# Altium footprint library Conectors.PcbLib: 123 footprints (part 2 of 8)
Each footprint in its own frame and in the unit in brackets; x right, y up, seen from the top. Pads: shape width x height; smd on the part's side, far side on the other; paste and mask are expansions set on the pad; w line width, h text height; cw(c..) or ccw(c..) is an arc to the next point about the centre after c.
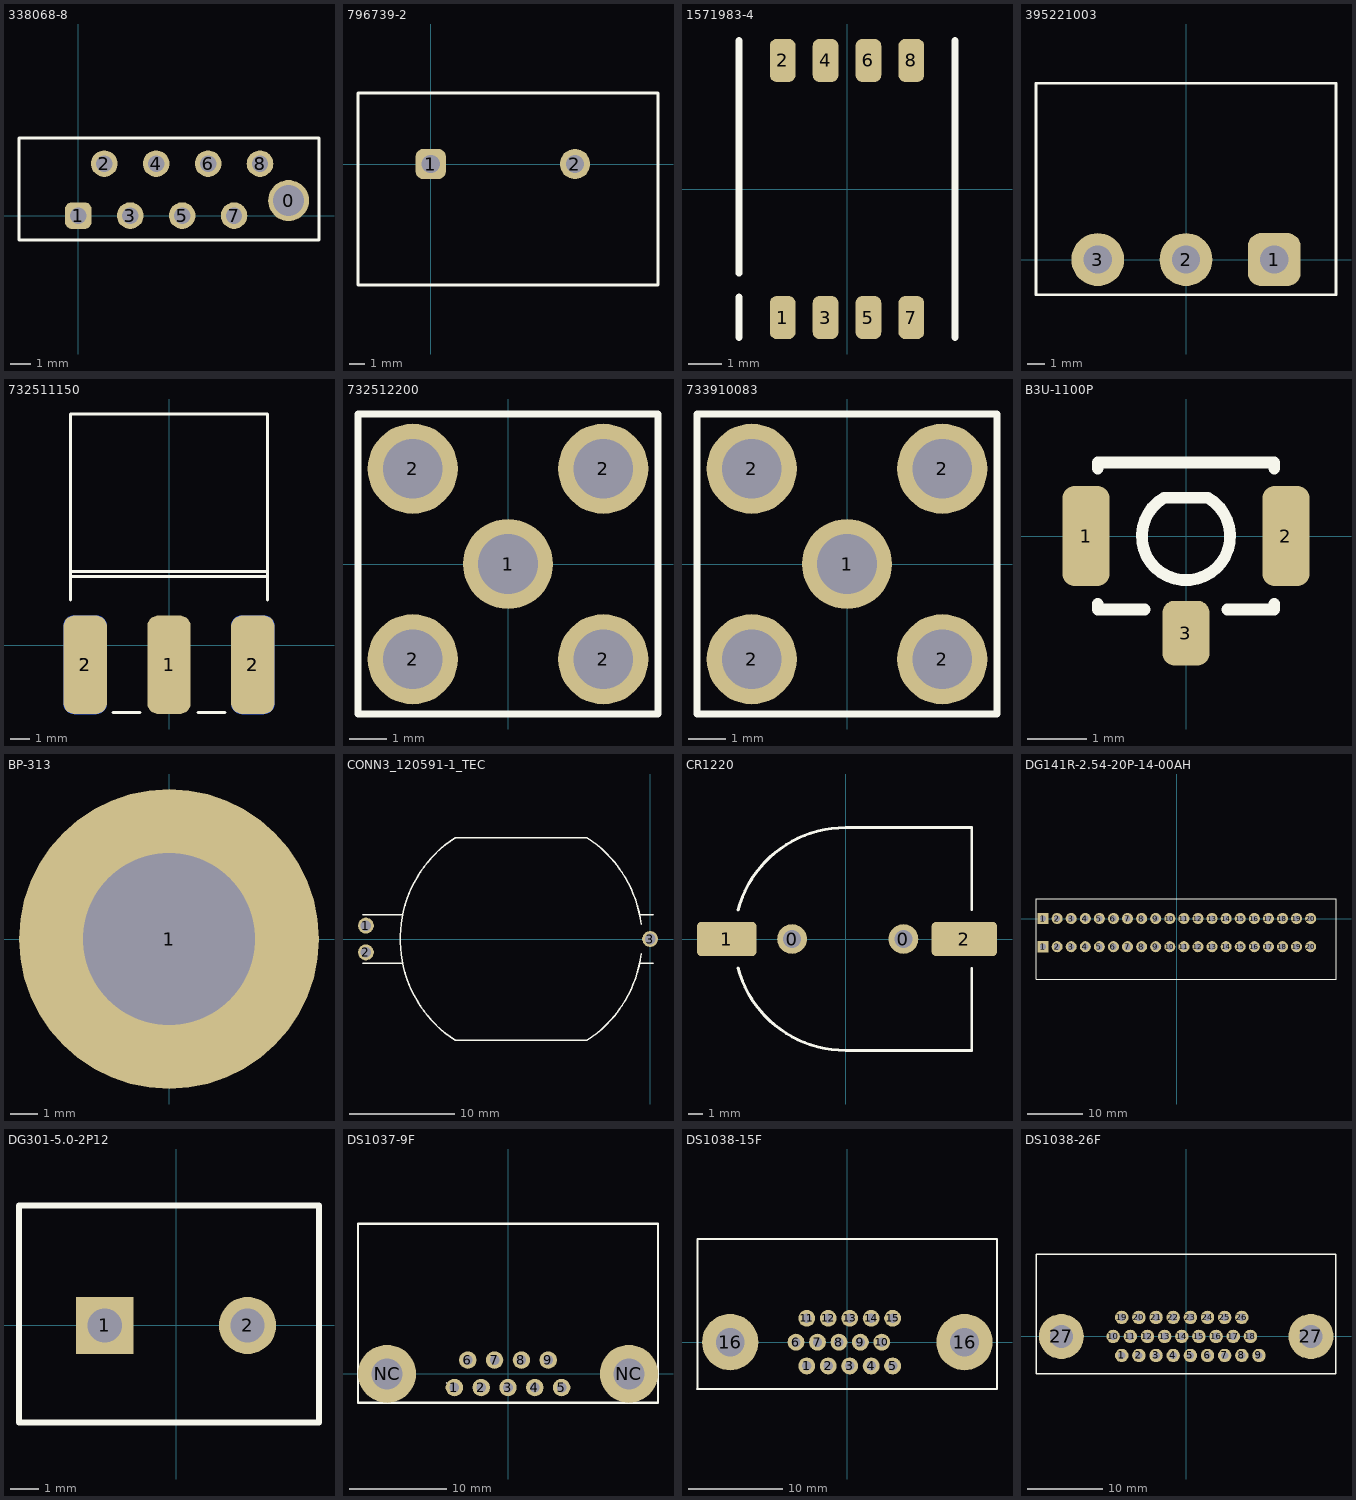
[diagram p1: the footprints below, top view; thin cyan lines are the x and y axes]

## 338068-8 [mm]
pads (9):
  round 2 hole 1.5: 0(10.287,0.737)
  rrect50% 1.3x1.3 hole 0.8: 1(0,0)
  round 1.3 hole 0.8: 2(1.27,2.54) 3(2.54,0) 4(3.81,2.54) 5(5.08,0) 6(6.35,2.54) 7(7.62,0) 8(8.89,2.54)
Top Overlay:
  lines w0.152: -2.9,-1.2 -2.9,3.8 11.775,3.8 11.775,-1.2 -2.9,-1.2
3D body "c-338068-8-f-3d.stp": height 4, standoff -3.1, extent -2.855,-1.23 11.775,3.77

## 796739-2 [mm]
pads (2):
  rrect50% 2x2 hole 1.2: 1(0,0)
  round 2 hole 1.2: 2(9.52,0)
Top Overlay:
  lines w0.2: -4.8,-8 -4.8,4.7 15,4.7 15,-8 -4.8,-8
3D body "c-796739-2-c-3d.stp": height 21.65, standoff -4.85, extent -4.72,-7.9 14.92,4.6

## 1571983-4 [mm]
pads (8):
  rrect50% 0.76x1.27 smd: 1(-1.905,-3.81) 2(-1.905,3.81) 3(-0.635,-3.81) 4(-0.635,3.81) 5(0.635,-3.81) 6(0.635,3.81) 7(1.905,-3.81) 8(1.905,3.81)
Top Overlay:
  lines w0.2: -3.2,-4.4 -3.2,-3.2 ; -3.2,-2.5 -3.2,4.4 ; 3.2,-4.4 3.2,4.4
3D body "1571983-4--3DModel-STEP-56544.STEP": height 2.31, standoff 0, extent -3.1,-4.065 3.1,4.065

## 395221003 [mm]
pads (3):
  rrect50% 3x3 hole 1.6: 1(5,0)
  round 3 hole 1.6: 2(0,0) 3(-5,0)
Top Overlay:
  lines w0.15: -8.5,-2 -8.5,10 8.5,10 8.5,-2 -8.5,-2
3D body "395221003.stp": height 8.38, standoff -3.81, extent -8.496,-2 8.496,9.938

## 732511150 [mm]
pads (5):
  rrect50% 2.2x5 smd: 1(0,-1) 2(-4.255,-1) 2(4.255,-1)
  rrect50% 2.2x5 smd far side: 2(-4.255,-1) 2(4.255,-1)
Top Overlay:
  lines w0.152: -4.991,2.285 -4.991,3.731 4.991,3.731 4.991,2.285 ; -2.842,-3.431 -1.476,-3.431 ; 1.476,-3.431 2.842,-3.431 ; -4.991,3.477 -4.991,11.732 4.991,11.732 4.991,3.477 -4.991,3.477
3D body "732511150.stp": height 4.36, standoff -3.56, extent -4.762,-2.746 4.763,11.528

## 732512200 [mm]
pads (5):
  round 2.4 hole 1.6: 1(0,0) 2(-2.54,-2.54) 2(-2.54,2.54) 2(2.54,-2.54) 2(2.54,2.54)
Top Overlay:
  lines w0.2: -4,-4 4,-4 4,4 -4,4 -4,-4
3D body "732512200.stp": height 11.15, standoff -2.79, extent -4.8,-16.561 4.8,2.989

## 733910083 [mm]
pads (5):
  round 2.4 hole 1.6: 1(0,0) 2(-2.54,-2.54) 2(-2.54,2.54) 2(2.54,-2.54) 2(2.54,2.54)
Top Overlay:
  lines w0.2: -4,-4 4,-4 4,4 -4,4 -4,-4
3D body "733910083.stp": height 10.1, standoff -3.4, extent -3.175,-11.6 3.175,3.2

## B3U-1100P [mm]
pads (3):
  rrect50% 0.8x1.7 smd: 1(-1.7,0) 2(1.7,0)
  rrect50% 0.8x1.1 smd: 3(0,-1.65)
Top Overlay:
  lines w0.2: -1.5,-1.15 -1.5,-1.25 -0.7,-1.25 ; -1.5,1.15 -1.5,1.25 1.5,1.25 1.5,1.15 ; 0.7,-1.25 1.5,-1.25 1.5,-1.15 ; -0.374,0.65 ccw(c0,0) 0.374,0.65 -0.374,0.65
3D body "PB_OMRON_B3U-1100P.stp": height 1.75, standoff 0, extent -2,-1.95 2,1.25

## BP-313 [mm]
pads (1):
  round 11 hole 6.3: 1(0,0)
3D body "Сборка7.STEP": height 8.25, standoff -6.75, extent -5.499,-5.499 5.5,5.5

## CONN3_120591-1_TEC [mm]
pads (3):
  round 1.5 hole 1: 1(-26.924,1.27) 2(-26.924,-1.27) 3(0,0)
Top Overlay:
  lines w0.152: -27.241,-2.291 -23.444,-2.291 ; -27.241,2.291 -23.444,2.291 ; -0.991,-2.291 0.318,-2.291 ; -0.991,2.291 0.318,2.291 ; -0.847,-1.396 cw(c-12.217,0) -5.978,-9.607 -18.456,-9.607 cw(c-12.217,0) -18.456,9.607 -5.978,9.607 cw(c-12.217,0) -0.847,1.396
3D body "c-120591-1-j1-3d.stp": height 6.62, standoff -2.83, extent -27.133,-9.525 0.172,9.525
3D body: height 0.25, standoff 0, extent -26.924,1.27 -26.67,1.524

## CR1220 [mm]
pads (4):
  round 2 hole 1.2: 0(-3.6,0) 0(3.9,0)
  rrect25% 4x2.3 smd: 1(-8,0)
  rrect25% 4.4x2.3 smd: 2(8,0)
Top Overlay:
  lines w0.2: -7.244,-1.941 ccw(c0,0) 0,-7.5 8.5,-7.5 8.5,-2 ; -7.244,1.941 cw(c0,0) 0,7.5 8.5,7.5 8.5,2
3D body "User Library-Battery Holder for CR1220 SMD.STEP": height 4.33, standoff -0.42, extent -8.951,-7.374 9.85,7.374

## DG141R-2.54-20P-14-00AH [mm]
pads (40):
  rect 2x2 hole 1.1: 1(-24.13,-5.08) 1(-24.13,0)
  round 2 hole 1.1: 2(-21.59,-5.08) 2(-21.59,0) 3(-19.05,-5.08) 3(-19.05,0) 4(-16.51,-5.08) 4(-16.51,0) 5(-13.97,-5.08) 5(-13.97,0) 6(-11.43,-5.08) 6(-11.43,0) 7(-8.89,-5.08) 7(-8.89,0) 8(-6.35,-5.08) 8(-6.35,0) 9(-3.81,-5.08) 9(-3.81,0) 10(-1.27,-5.08) 10(-1.27,0) 11(1.27,-5.08) 11(1.27,0) 12(3.81,-5.08) 12(3.81,0) 13(6.35,-5.08) 13(6.35,0) 14(8.89,-5.08) 14(8.89,0) 15(11.43,-5.08) 15(11.43,0) 16(13.97,-5.08) 16(13.97,0) 17(16.51,-5.08) 17(16.51,0) 18(19.05,-5.08) 18(19.05,0) 19(21.59,-5.08) 19(21.59,0) 20(24.13,-5.08) 20(24.13,0)
Top Overlay:
  lines w0.2: -25.4,-10.922 28.702,-10.922 28.702,3.556 -25.4,3.556 -25.4,-10.922
3D body "DG141R-2.54-20P-1Y-00A(H).stp": height 12.6, standoff -3.2, extent -25.019,-10.541 28.321,3.059

## DG301-5.0-2P12 [mm]
pads (2):
  rect 2x2 hole 1.2: 1(-2.5,0)
  round 2 hole 1.2: 2(2.5,0)
Top Overlay:
  lines w0.2: -5.5,-3.4 -5.5,4.2 5,4.2 5,-3.4 -5.5,-3.4
3D body "User Library-DG301-5_0-2P12.STEP": height 10, standoff -4.16, extent -5.6,-3.4 5,4.2

## DS1037-9F [mm]
pads (11):
  round 1.8 hole 1: 1(-5.54,-1.42) 2(-2.77,-1.42) 3(0,-1.42) 4(2.77,-1.42) 5(5.54,-1.42) 6(-4.155,1.42) 7(-1.385,1.42) 8(1.385,1.42) 9(4.155,1.42)
  round 6 hole 3.2: NC(-12.5,0) NC(12.5,0)
Top Overlay:
  lines w0.254: -15.5,-3 -4.25,-3 4.25,-3 15.5,-3 15.5,15.5 -15.5,15.5 -15.5,-3
  text "*" at -6.5,-3.138 h3
3D body "User Library-DRB-9FA-1.STEP": height 12.5, standoff -4.65, extent -15.42,-2.48 15.42,15.92

## DS1038-15F [mm]
pads (17):
  round 1.8 hole 1: 1(-4.332,-2.54) 2(-2.042,-2.54) 3(0.248,-2.54) 4(2.538,-2.54) 5(4.828,-2.54) 6(-5.477,0) 7(-3.187,0) 8(-0.897,0) 9(1.393,0) 10(3.683,0) 11(-4.332,2.54) 12(-2.042,2.54) 13(0.248,2.54) 14(2.538,2.54) 15(4.828,2.54)
  round 6 hole 3.05: 16(-12.5,0) 16(12.5,0)
Top Overlay:
  lines w0.2: -16.037,-5 15.963,-5 15.963,11 -16,11 -16,-4.977
3D body "DHR-15F.STEP": height 12.5, standoff -4.65, extent -15.42,-4.53 15.42,17.57

## DS1038-26F [mm]
pads (28):
  round 1.8 hole 1: 1(-8.605,-2.54) 2(-6.315,-2.54) 3(-4.025,-2.54) 4(-1.735,-2.54) 5(0.555,-2.54) 6(2.845,-2.54) 7(5.135,-2.54) 8(7.425,-2.54) 9(9.715,-2.54) 10(-9.75,0) 11(-7.46,0) 12(-5.17,0) 13(-2.88,0) 14(-0.59,0) 15(1.7,0) 16(3.99,0) 17(6.28,0) 18(8.57,0) 19(-8.605,2.54) 20(-6.315,2.54) 21(-4.025,2.54) 22(-1.735,2.54) 23(0.555,2.54) 24(2.845,2.54) 25(5.135,2.54) 26(7.425,2.54)
  round 6 hole 3.05: 27(-16.66,0) 27(16.66,0)
Top Overlay:
  lines w0.2: -20.052,-5 20,-5 20,11 -20.052,11 -20.052,-5
3D body "User Library-DHR-26F.STEP": height 12.5, standoff -4.65, extent -19.57,-4.53 19.57,17.57